# Altium footprint library SG__PCB_HOLE_Connector.PcbLib: 154 footprints (part 4 of 10)
Each footprint in its own frame and in the unit in brackets; x right, y up, seen from the top. Pads: shape width x height; smd on the part's side, far side on the other; paste and mask are expansions set on the pad; w line width, h text height; cw(c..) or ccw(c..) is an arc to the next point about the centre after c.
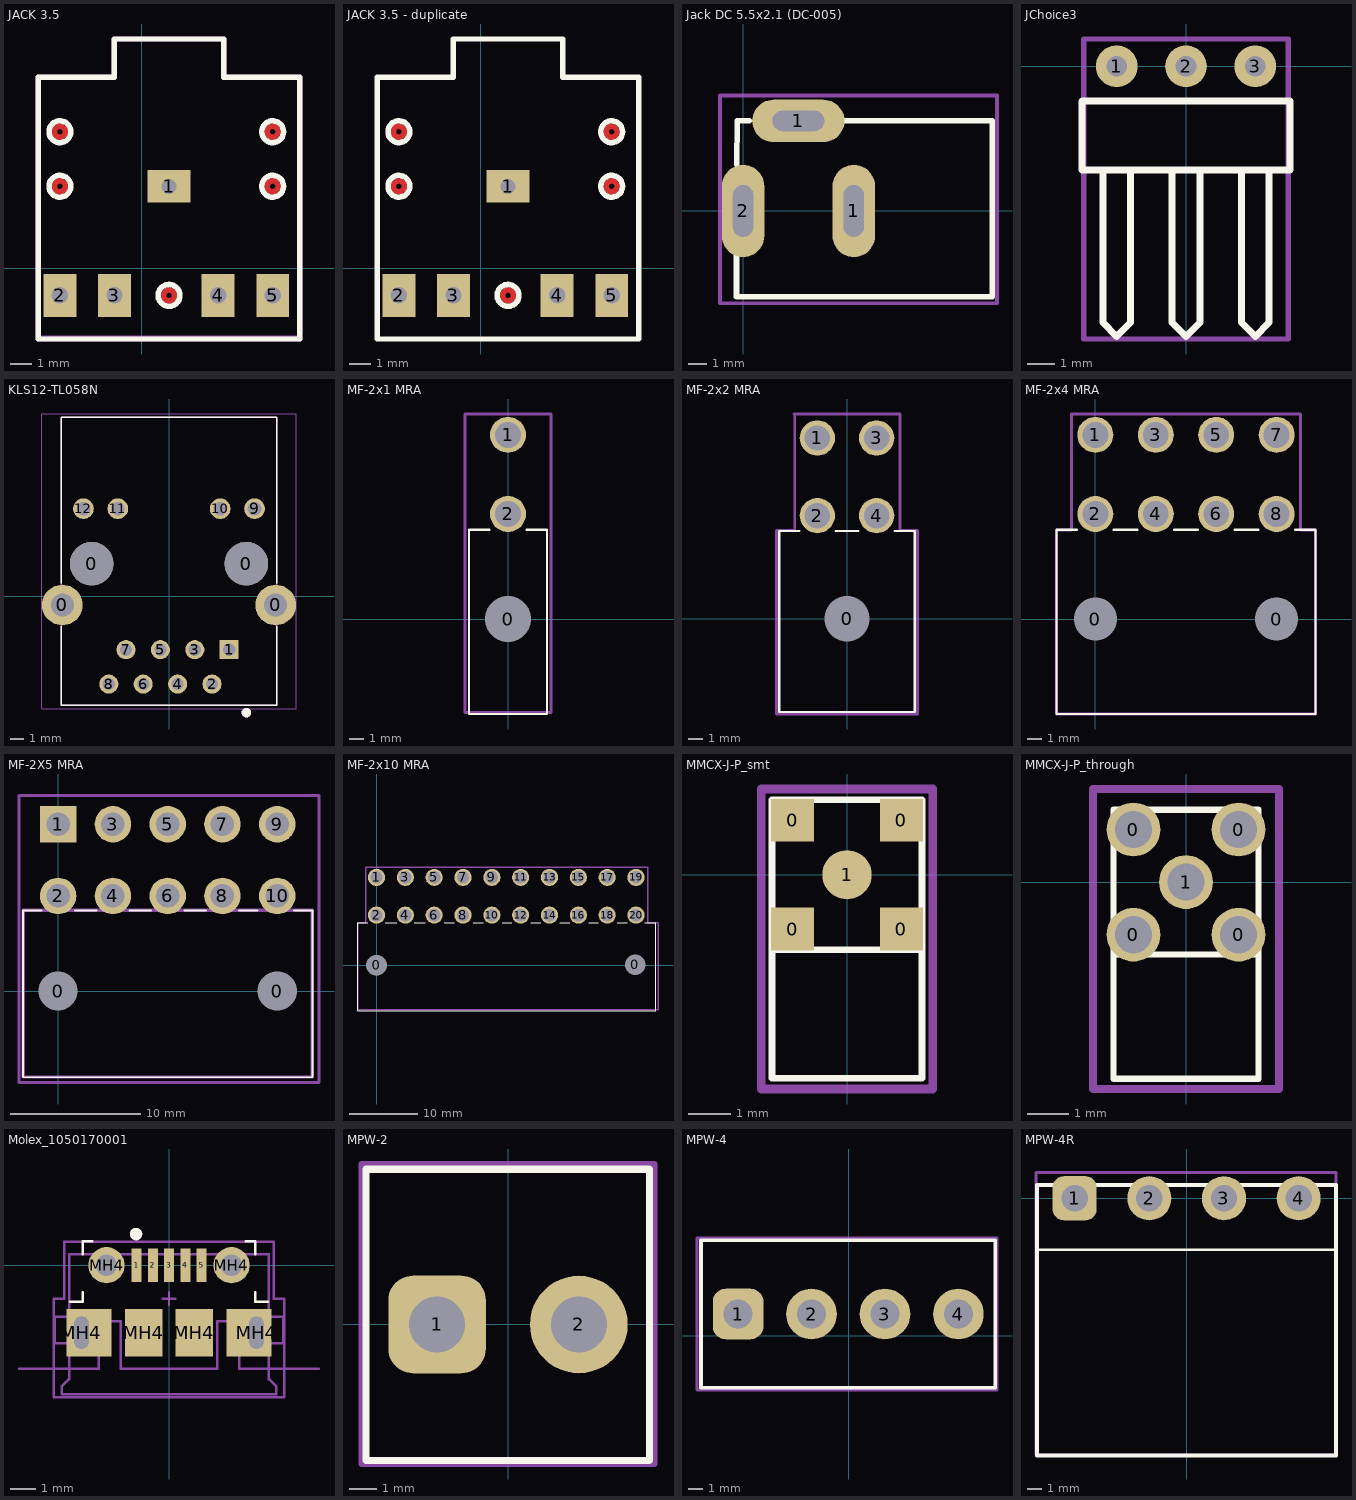
[diagram p3: the footprints below, top view; thin cyan lines are the x and y axes]

## JACK 3.5 [mil]
pads (5):
  rect 78.74x60 hole 27.56 square: 1(50,150)
  rect 60x78.74 hole 30: 2(-150,-50) 3(-50,-50) 4(140,-50) 5(240,-50)
Top Layer:
  circle w10: c50,-50 r10
  circle w10: c240,150 r10
  circle w10: c240,250 r10
  circle w10: c-150,150 r10
  circle w10: c-150,250 r10
Top Overlay:
  circle w10: c240,250 r20
  circle w10: c240,150 r20
  circle w10: c-150,250 r20
  circle w10: c-150,150 r20
  circle w10: c50,-50 r20
  lines w10: -190,-130 290,-130 290,350 150,350 150,420 -50,420 -50,350 -190,350 -190,-130
Top Assembly:
  lines w10: -190,-130 -190,350 -50,350 -50,420 150,420 150,350 290,350 290,-130 -190,-130
Top Courtyard:
  lines w7.87: -190,-127.95 -190,350 -51.76,350 -51.76,420 150,420 150,350 290,350 290,-127.95 -190,-127.95
3D body "jack 3-5.stp": height 216.54, standoff -118.11, extent -192.44,-135.59 280,415.59

## JACK 3.5 - duplicate [mil]
pads (5):
  rect 78.74x60 hole 27.56 square: 1(50,150)
  rect 60x78.74 hole 30: 2(-150,-50) 3(-50,-50) 4(140,-50) 5(240,-50)
Top Layer:
  circle w10: c50,-50 r10
  circle w10: c240,150 r10
  circle w10: c240,250 r10
  circle w10: c-150,150 r10
  circle w10: c-150,250 r10
Top Overlay:
  circle w10: c240,250 r20
  circle w10: c240,150 r20
  circle w10: c-150,250 r20
  circle w10: c-150,150 r20
  circle w10: c50,-50 r20
  lines w10: -190,-130 290,-130 290,350 150,350 150,420 -50,420 -50,350 -190,350 -190,-130
3D body "jack 3-5.stp": height 216.54, standoff -118.11, extent -192.44,-135.59 280,415.59

## Jack DC 5.5x2.1 (DC-005) [mm]
pads (3):
  oval 5x2.3 hole 1.1 slot 2.8 at 0 deg: 1(2.993,4.88)
  oval 2.3x5 hole 1.1 slot 2.8 at 90 deg: 1(5.993,0) 2(0,0)
Top Overlay:
  lines w0.3: -0.359,-2.15 -0.359,-4.636 13.5,-4.636 13.5,4.88 4.491,4.88 ; -0.353,2.5 -0.326,4.88 0.324,4.88
Top Courtyard:
  lines w0.2: -1.25,-5 -1.25,6.25 13.75,6.25 13.75,-5 -1.25,-5
3D body "User Library-dc range - dc connector[4840_2201].STEP": height 12, standoff -2.5, extent -0.326,-4.626 13.5,4.88

## JChoice3 [mil]
pads (3):
  round 60 hole 30: 1(-100,0) 2(0,0) 3(100,0)
Top Overlay:
  lines w10: -120,-150 -120,-370 -100,-390 -80,-370 -80,-150 ; -20,-150 -20,-370 0,-390 20,-370 20,-150 ; 80,-150 80,-370 100,-390 120,-370 120,-150 ; -150,-150 150,-150 150,-50 -150,-50 -150,-150
Top Courtyard:
  lines w7.87: -147.64,-393.7 -147.64,39.37 147.64,39.37 147.64,-393.7 -147.64,-393.7
3D body "pls2r.stp": height 168.11, standoff -51.18, extent -50,-388.03 150,19.06
3D body "pls2r.stp": height 168.11, standoff -51.18, extent -150,-388.03 50,19.06

## KLS12-TL058N [mm] "Ethernet connector"
pads (16):
  round 3 hole 1.7: 0(-7.875,-0.635) 0(7.875,-0.635)
  round 3.2 hole 3.2 unplated: 0(-5.715,2.415) 0(5.715,2.415)
  rect 1.408x1.408 hole 0.9: 1(4.445,-3.935)
  round 1.408 hole 0.9: 2(3.175,-6.475) 3(1.905,-3.935) 4(0.635,-6.475) 5(-0.635,-3.935) 6(-1.905,-6.475) 7(-3.175,-3.935) 8(-4.445,-6.475)
  round 1.53 hole 1.02: 9(6.32,6.475) 10(3.78,6.475) 11(-3.78,6.475) 12(-6.32,6.475)
Top Overlay:
  circle w0.5: c5.715,-8.585 r0.1
  lines w0.127: -7.965,-2.23 -7.965,-8.035 7.965,-8.035 7.965,-2.23 ; -7.965,0.96 -7.965,13.215 7.965,13.215 7.965,0.96
Top Assembly:
  circle w0.5: c5.715,-8.585 r0.1
  lines w0.127: -7.965,-8.035 7.965,-8.035 7.965,13.215 -7.965,13.215 -7.965,-8.035
Top Courtyard:
  lines w0.05: -9.4,-8.285 -9.4,13.465 9.4,13.465 9.4,-8.285 -9.4,-8.285
3D body "User Library-KLS12-TL058N.step": height 14.31, standoff -3.95, extent -8.948,-8.182 8.81,13.118

## MF-2x1 MRA [mm]
height 12
pads (3):
  round 2.5 hole 3.2 unplated mask+0.05: 0(0,0)
  round 2.5 hole 1.8 mask+0.05: 1(0,12.8) 2(0,7.3)
Top Overlay:
  lines w0.15: -1.275,6.2 -2.7,6.2 -2.7,-6.6 2.7,-6.6 2.7,6.2 1.275,6.2
Top Courtyard:
  lines w0.2: -3,-6.5 3,-6.5 3,14.25 -3,14.25 -3,-6.5
3D body "Mini-Fit 2 pin.STEP": height 11.4, standoff -3.6, extent -2.9,-6.643 2.9,13.292

## MF-2x2 MRA [mm]
height 12
pads (5):
  round 2.5 hole 3.2 unplated mask+0.05: 0(0,0)
  round 2.5 hole 1.8 mask+0.05: 1(-2.1,12.8) 2(-2.1,7.3) 3(2.1,12.8) 4(2.1,7.3)
Top Overlay:
  lines w0.15: -3.375,6.2 -4.8,6.2 -4.8,-6.6 0.6,-6.6 ; -0.825,6.2 0.6,6.2 ; -0.6,-6.6 4.8,-6.6 4.8,6.2 3.375,6.2 ; -0.6,6.2 0.825,6.2
Top Courtyard:
  lines w0.2: -5,-6.75 -5,6.25 -3.704,6.25 -3.704,14.5 -3.75,14.5 3.75,14.5 3.75,6.25 5,6.25 5,-6.75 -5,-6.75
3D body "Mini-Fit 4pin (MF-4MRA).STEP": height 11.4, standoff -3.6, extent -4.85,-6.66 5.15,13.275

## MF-2x4 MRA [mm]
height 12
pads (10):
  round 2.5 hole 3 unplated mask+0.05: 0(0,0) 0(12.6,0)
  round 2.5 hole 1.8 mask+0.05: 1(0,12.8) 2(0,7.3) 3(4.2,12.8) 4(4.2,7.3) 5(8.4,12.8) 6(8.4,7.3) 7(12.6,12.8) 8(12.6,7.3)
Top Overlay:
  lines w0.15: -1.275,6.2 -2.7,6.2 -2.7,-6.6 2.7,-6.6 ; 1.275,6.2 2.7,6.2 ; 1.5,-6.6 6.9,-6.6 ; 1.5,6.2 2.925,6.2 ; 5.475,6.2 6.9,6.2 ; 5.7,-6.6 11.1,-6.6 ; 5.7,6.2 7.125,6.2 ; 9.675,6.2 11.1,6.2 ; 9.9,-6.6 15.3,-6.6 15.3,6.2 13.875,6.2 ; 9.9,6.2 11.325,6.2
Top Courtyard:
  lines w0.2: -2.7,-6.6 15.3,-6.6 15.3,6.2 14.25,6.2 14.25,14.25 -1.65,14.25 -1.65,6.2 -2.7,6.2 -2.7,-6.6
3D body "Mini-Fit 2 pin.STEP": height 11.4, standoff -3.6, extent -2.9,-6.643 2.9,13.292
3D body "Mini-Fit 2 pin.STEP": height 11.4, standoff -3.6, extent 1.3,-6.643 7.1,13.292
3D body "Mini-Fit 2 pin.STEP": height 11.4, standoff -3.6, extent 5.5,-6.643 11.3,13.292
3D body "Mini-Fit 2 pin.STEP": height 11.4, standoff -3.6, extent 9.7,-6.643 15.5,13.292

## MF-2X5 MRA [mm]
height 12
pads (12):
  round 2.5 hole 3 unplated mask+0.05: 0(0,0) 0(16.8,0)
  rect 2.8x2.8 hole 1.8 mask+0.05: 1(0,12.8)
  round 2.8 hole 1.8 mask+0.05: 2(0,7.3) 3(4.2,12.8) 4(4.2,7.3) 5(8.4,12.8) 6(8.4,7.3) 7(12.6,12.8) 8(12.6,7.3) 9(16.8,12.8) 10(16.8,7.3)
Top Overlay:
  lines w0.15: -1.275,6.2 -2.7,6.2 -2.7,-6.6 2.7,-6.6 ; 1.275,6.2 2.7,6.2 ; 1.5,-6.6 6.9,-6.6 ; 1.5,6.2 2.925,6.2 ; 5.475,6.2 6.9,6.2 ; 5.7,-6.6 11.1,-6.6 ; 5.7,6.2 7.125,6.2 ; 9.675,6.2 11.1,6.2 ; 9.9,-6.6 19.5,-6.6 19.5,6.2 18.075,6.2 ; 9.9,6.2 11.325,6.2 ; 13.875,6.2 15.3,6.2 13.875,6.2
Top Assembly:
  lines w0.254: -2.675,-6.574 19.491,-6.574 19.491,6.195 -2.675,6.195 -2.675,-6.574
Top Courtyard:
  lines w0.254: -3,-7 20,-7 20,15 -3,15 -3,-7
3D body "Mini-Fit 2 pin.STEP": height 11.4, standoff -3.6, extent 13.9,-6.643 19.7,13.292
3D body "Mini-Fit 2 pin.STEP": height 11.4, standoff -3.6, extent 9.7,-6.643 15.5,13.292
3D body "Mini-Fit 2 pin.STEP": height 11.4, standoff -3.6, extent 5.5,-6.643 11.3,13.292
3D body "Mini-Fit 2 pin.STEP": height 11.4, standoff -3.6, extent 1.3,-6.643 7.1,13.292
3D body "Mini-Fit 2 pin.STEP": height 11.4, standoff -3.6, extent -2.9,-6.643 2.9,13.292

## MF-2x10 MRA [mm]
height 12
pads (22):
  round 2.5 hole 3 unplated mask+0.05: 0(0,0) 0(37.7,0.1)
  round 2.5 hole 1.8 mask+0.05: 1(0,12.8) 2(0,7.3) 3(4.2,12.8) 4(4.2,7.3) 5(8.4,12.8) 6(8.4,7.3) 7(12.6,12.8) 8(12.6,7.3) 9(16.8,12.8) 10(16.8,7.3) 11(21,12.8) 12(21,7.3) 13(25.2,12.8) 14(25.2,7.3) 15(29.4,12.8) 16(29.4,7.3) 17(33.6,12.8) 18(33.6,7.3) 19(37.8,12.8) 20(37.8,7.3)
Top Overlay:
  lines w0.15: -1.275,6.2 -2.7,6.2 -2.7,-6.6 2.7,-6.6 ; 1.275,6.2 2.7,6.2 ; 1.5,-6.6 6.9,-6.6 ; 1.5,6.2 2.925,6.2 ; 5.475,6.2 6.9,6.2 ; 5.7,-6.6 11.1,-6.6 ; 5.7,6.2 7.125,6.2 ; 9.9,-6.6 40.7,-6.6 40.7,6.2 39.1,6.2 ; 9.9,6.2 11.325,6.2 ; 14.1,6.2 15.525,6.2 ; 18.3,6.2 19.725,6.2 ; 22.5,6.2 23.925,6.2 ; 26.7,6.2 28.125,6.2 ; 30.9,6.2 32.325,6.2 ; 35.1,6.2 36.525,6.2
Top Courtyard:
  lines w0.2: -2.7,-6.447 -2.7,6.2 -1.565,6.2 -1.565,14.25 39.5,14.25 39.5,6.2 41,6.2 41,-6.447 -2.7,-6.447
3D body "mf2x10.stp": height 11.4, standoff -3.6, extent -2.7,-6.535 40.9,13.4

## MMCX-J-P_smt [mm] "rf con"
pads (5):
  rect 1x1 smd: 0(-1.27,-1.27) 0(-1.27,1.27) 0(1.27,-1.27) 0(1.27,1.27)
  round 1.15 smd: 1(0,0)
Top Overlay:
  lines w0.152: -1.75,-1.75 1.75,-1.75 ; -1.75,-4.75 1.75,-4.75 1.75,1.75 -1.75,1.75 -1.75,-4.75
Top Courtyard:
  lines w0.2: -2,-5 2,-5 2,2 -2,2 -2,-5
3D body: height 4.6, standoff 0, extent -1.75,-1.75 1.75,1.75
3D body: height 4.6, standoff 1.1, extent -1.75,-4.75 1.75,-1.75

## MMCX-J-P_through [mm] "rf con"
pads (5):
  round 1.3 hole 0.9: 0(-1.27,-1.27) 0(-1.27,1.27) 0(1.27,-1.27) 0(1.27,1.27) 1(0,0)
Top Overlay:
  lines w0.152: -1.75,-1.75 1.75,-1.75 ; -1.75,-4.75 -1.75,1.75 1.75,1.75 1.75,-4.75 -1.75,-4.75
Top Courtyard:
  lines w0.2: -2.25,-5 2.25,-5 2.25,2.25 -2.25,2.25 -2.25,-5
3D body: height 4.6, standoff 1.1, extent -1.75,-4.75 1.75,-1.75
3D body: height 4.6, standoff 0, extent -1.75,-1.75 1.75,1.75

## Molex_1050170001 [mm] "USB Micro-B Connector"
height 2.667
pads (11):
  rect 0.4x1.35 smd: 1(-1.3,0) 2(-0.65,0) 3(0,0) 4(0.65,0) 5(1.3,0)
  rect 1.8x1.9 hole 0.6 slot 1.3 at 90 deg copper offset 0.3,0: MH4(-3.5,-2.7)
  round 1.45 hole 0.85: MH4(-2.5,0) MH4(2.5,0)
  rect 1.5x1.9 smd: MH4(-1,-2.7) MH4(1,-2.7)
  rect 1.8x1.9 hole 0.6 slot 1.3 at 90 deg copper offset -0.3,0: MH4(3.5,-2.7)
Top Overlay:
  circle w0.25: c-1.319,1.245 r0.125
  lines w0.1: -3.953,-1.465 -3.445,-1.465 -3.445,-1.084 ; -3.445,0.44 -3.445,0.948 -3.064,0.948 ; 3.064,0.948 3.445,0.948 3.445,0.44 ; 3.445,-1.084 3.445,-1.465 3.953,-1.465
Top Assembly:
  lines w0.1: -4,0.442 -4,-2.058 -4.572,-2.058 -4.572,-3.116 -4,-3.116 -4,-4.558 -4.3,-4.858 -4.3,-5.158 4.3,-5.158 4.3,-4.858 4,-4.558 4,-3.116 4.572,-3.116 4.572,-2.058 4,-2.058 4,0.442 ; -4,0.442 4,0.442 ; -4,0.442 4,0.442
Dimensions:
  lines w0.1: -6,-4.137 -2.82,-4.137 -2.82,-2.238 -1.92,-2.238 -1.92,-4.137 0,-4.137 1.92,-4.137 1.92,-2.238 2.82,-2.238 2.82,-4.137 6,-4.137
  text "Board edge" at 5.588,-4.005 h0.2
Top Courtyard:
  lines w0.1: -4.2,0.937 4.2,0.937 ; -4.2,0.94 -4.2,-1.338 -4.6,-1.338 -4.6,-4.137 -4.6,-5.275 4.6,-5.275 4.6,-4.137 4.6,-1.338 4.2,-1.338 4.2,0.94 ; -0.254,-1.338 0.254,-1.338 ; 0,-1.592 0,-1.084
3D body "1050170001.stp": height 2.58, standoff -0.72, extent -4.1,-5.207 4.1,0.193

## MPW-2 [mm]
height 12
pads (2):
  rrect50% 3.5x3.5 hole 2: 1(-2.54,0)
  round 3.5 hole 2: 2(2.54,0)
Top Overlay:
  lines w0.254: -5.085,-4.877 -5.085,5.563 5.075,5.563 5.075,-4.877 -5.085,-4.877
Top Courtyard:
  lines w0.2: -5.25,-5 -5.25,5.75 5.25,5.75 5.25,-5 -5.25,-5
3D body "User Library-MPW-2.step": height 14.17, standoff -3.23, extent -5.055,-4.851 5.105,5.603

## MPW-4 [mm]
height 12
pads (4):
  rrect50% 3.5x3.5 hole 2: 1(-7.66,1.5)
  round 3.5 hole 2: 2(-2.58,1.5) 3(2.5,1.5) 4(7.58,1.5)
Top Overlay:
  lines w0.254: 10.095,-3.605 -10.225,-3.605 -10.225,6.595 10.12,6.595 10.12,-3.605
Top Courtyard:
  lines w0.2: -10.375,6.75 10.25,6.75 10.25,-3.75 -10.5,-3.75 -10.5,6.75 -10.25,6.75
3D body "MPW-4 (DS1074-4 M).STEP": height 14, standoff -3.5, extent -10.214,-3.439 10.106,6.647

## MPW-4R [mm]
height 12
pads (4):
  rrect50% 3x3 hole 1.8: 1(-7.62,0)
  round 3 hole 1.8: 2(-2.54,0) 3(2.54,0) 4(7.62,0)
Top Overlay:
  lines w0.152: -10.185,-3.5 10.16,-3.5
  lines w0.254: -10.185,-17.5 10.16,-17.5 10.16,0.9 -10.185,0.9 -10.185,-17.5
Top Courtyard:
  lines w0.2: -10.25,-17.45 -10.25,1.75 10.16,1.75 10.16,-17.45 -10.25,-17.45
3D body "MPW-4R (DS1074-4 MR).STEP": height 10.09, standoff -3.7, extent -10.181,-17.553 10.139,0.517